# Altium footprint library CustomCase.PcbLib: 271 footprints (part 2 of 17)
Each footprint in its own frame and in the unit in brackets; x right, y up, seen from the top. Pads: shape width x height; smd on the part's side, far side on the other; paste and mask are expansions set on the pad; w line width, h text height; cw(c..) or ccw(c..) is an arc to the next point about the centre after c.
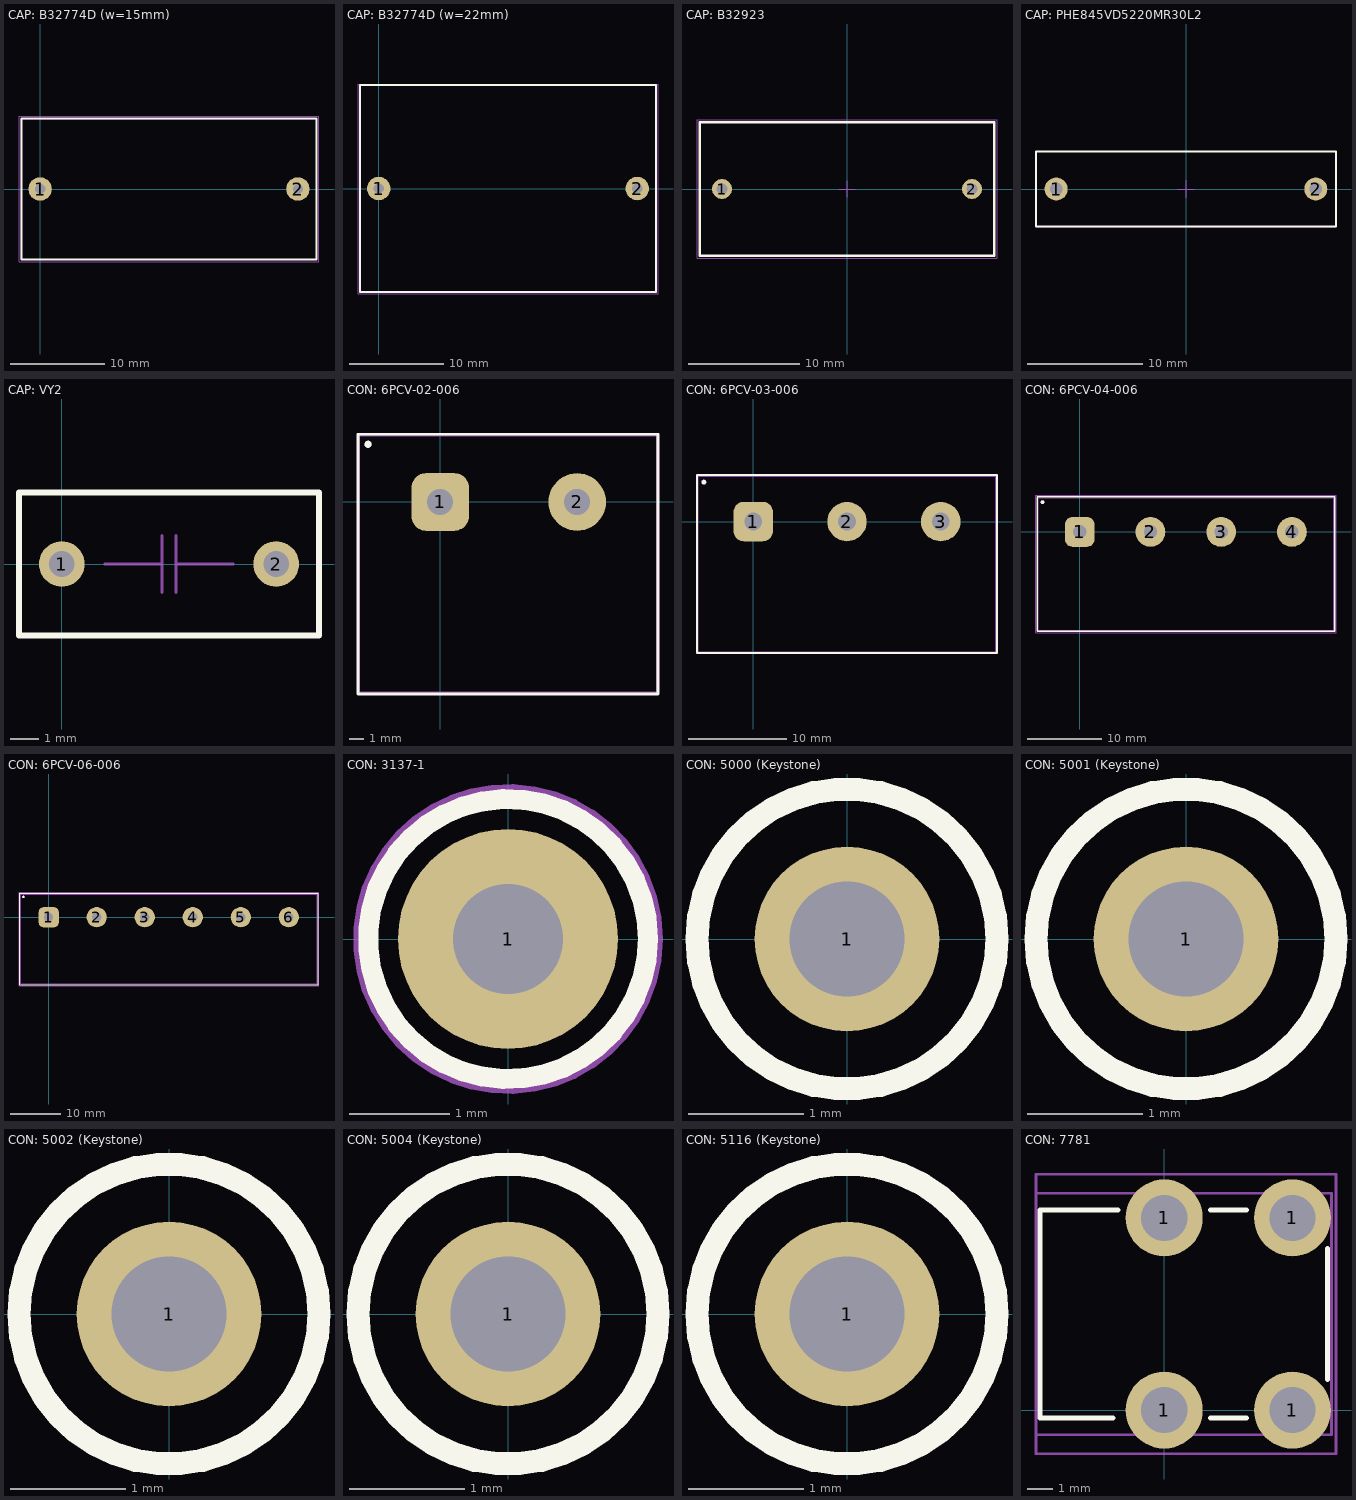
[diagram p1: the footprints below, top view; thin cyan lines are the x and y axes]

## CAP: B32774D (w=15mm) [mm]
pads (2):
  round 2.5 hole 1.1: 1(0,0) 2(27.5,0)
Top Overlay:
  lines w0.2: -2,-7.5 -2,7.5 29.5,7.5 29.5,-7.5 -2,-7.5
Top Assy:
  lines w0.1: -2,-7.5 -2,7.5 29.5,7.5 29.5,-7.5 -2,-7.5
Size Area:
  lines w0.1: -2.25,-7.75 -2.25,7.75 29.75,7.75 29.75,-7.75 -2.25,-7.75
3D body "2.STEP": height 24.55, standoff -2.95, extent -2,-7.5 29.5,7.5

## CAP: B32774D (w=22mm) [mm]
pads (2):
  round 2.5 hole 1.1: 1(0,0) 2(27.5,0)
Top Overlay:
  lines w0.2: -2,-11 -2,11 29.5,11 29.5,-11 -2,-11
Top Assy:
  lines w0.1: -2,-11 29.5,-11 29.5,11 -2,11 -2,-11
Size Area:
  lines w0.1: -2.2,-11.2 -2.2,11.1 29.7,11.1 29.7,-11.2 -2.2,-11.2
3D body "B32774D (w=22mm).STEP": height 36.5, standoff -3, extent -2,-11 29.5,11

## CAP: B32923 [mm]
pads (2):
  round 1.8 hole 1: 1(-11.25,0) 2(11.25,0)
Top Overlay:
  lines w0.2: -13.25,-6 13.25,-6 13.25,6 -13.25,6 -13.25,-6
Top Assy:
  lines w0.1: -13.25,-6 -13.25,6 13.25,6 13.25,-6 -13.25,-6
Size Area:
  lines w0.1: -0.75,0 0.75,0 ; 0,-0.75 0,0.75 ; -13.5,-6.25 13.5,-6.25 13.5,6.25 -13.5,6.25 -13.5,-6.25
3D body "B32923.STEP": height 22, standoff -3, extent -13.25,-6 13.25,6

## CAP: PHE845VD5220MR30L2 [mm]
pads (2):
  round 2 hole 1.1: 1(-11.25,-0.003) 2(11.25,-0.003)
Top Overlay:
  lines w0.2: -13,-3.253 13,-3.253 13,3.253 -13,3.253 -13,-3.253
Top Assy:
  lines w0.1: -13,-3.253 -13,3.253 13,3.253 13,-3.253 -13,-3.253
Size Area:
  lines w0.1: -0.75,-0.003 0.75,-0.003 ; 0,-0.75 0,0.75 ; -13,-3.253 -13,3.253 13,3.253 13,-3.253 -13,-3.253
3D body "кап.STEP": height 14.55, standoff -3.95, extent -13,-3.253 13,3.253

## CAP: VY2 [mm]
pads (2):
  round 1.6 hole 0.9: 1(0,0) 2(7.5,0)
Top Overlay:
  lines w0.2: 9,-2.5 -1.5,-2.5 -1.5,2.5 9,2.5 9,-2.5 ; 9,-2.5 9,-2.5
Top Assy:
  lines w0.1: 1.5,0 3.5,0 3.5,1 3.5,-1 ; 4,-1 4,1 4,0 6,0 ; -1.5,-2.5 9,-2.5 9,2.5 -1.5,2.5 -1.5,-2.5
Size Area:
  lines w0.1: -1.5,-2.5 -1.5,-2.5 ; -1.5,-2.5 9,-2.5 9,2.5 -1.5,2.5 -1.5,-2.5
3D body "777.STEP": height 14.75, standoff -1.75, extent -1.5,-2.5 9,2.5

## CON: 6PCV-02-006 [mm]
pads (4):
  rrect50% 4x4 hole 1.8: 1(0,0)
  round 4 hole 1.8: 2(9.5,0)
  round 0.5 on Mech1: ""(-5,4)
  round 0.5 on Top Overlay: ""(-5,4)
Top Overlay:
  lines w0.2: -5.7,-13.3 15.1,-13.3 15.1,4.7 -5.7,4.7 -5.7,-13.3
Top Assy:
  lines w0.1: -5.6,-13.2 15,-13.2 15,4.58 -5.6,4.58 -5.6,-13.2
  text "1" at -0.2,-3.6 h2
  text "2" at 9.2,-3.6 h2
Size Area:
  lines w0.1: -5.7,-13.3 -5.7,4.7 15.1,4.7 15.1,-13.3 -5.7,-13.3
3D body "02.STEP": height 15.96, standoff -4.99, extent -5.6,-13.2 15,4.58

## CON: 6PCV-03-006 [mm]
pads (4):
  rrect50% 4x4 hole 1.8: 1(0,0)
  round 4 hole 1.8: 2(9.5,0) 3(19,0)
  round 0.5 on Top Overlay: ""(-5,4)
Top Overlay:
  lines w0.2: -5.7,-13.3 24.7,-13.3 24.7,4.7 -5.7,4.7 -5.7,-13.3
Top Assy:
  lines w0.1: -5.562,-13.2 24.562,-13.2 24.562,4.58 -5.562,4.58 -5.562,-13.2
  text "3" at 18.8,-3.6 h2
  text "2" at 9.2,-3.6 h2
  text "1" at -0.2,-3.6 h2
Size Area:
  lines w0.1: -5.675,-13.3 24.675,-13.3 24.675,4.675 -5.675,4.675 -5.675,-13.3
3D body "03.STEP": height 15.96, standoff -4.99, extent -5.562,-13.2 24.562,4.58

## CON: 6PCV-04-006 [mm]
pads (6):
  rrect50% 4x4 hole 1.8: 1(0,0)
  round 4 hole 1.8: 2(9.5,0) 3(19,0) 4(28.5,0)
  round 0.5 on Mech1: ""(-5,4)
  round 0.5 on Top Overlay: ""(-5,4)
Top Overlay:
  lines w0.2: -5.7,-13.35 -5.7,4.725 34.25,4.725 34.25,-13.35 -5.7,-13.35
Top Assy:
  lines w0.1: -5.55,-13.2 -5.55,4.58 34.1,4.58 34.1,-13.2 -5.55,-13.2
  text "1" at -0.2,-3.6 h2
  text "2" at 9.2,-3.6 h2
  text "3" at 18.8,-3.6 h2
  text "4" at 28.2,-3.6 h2
Size Area:
  lines w0.1: -5.875,-13.525 -5.875,4.9 34.425,4.9 34.425,-13.525 -5.875,-13.525
3D body "6pcv-04-006.STEP": height 15.96, standoff -4.99, extent -5.525,-13.18 34.125,4.6

## CON: 6PCV-06-006 [mm]
pads (8):
  rrect50% 4x4 hole 1.8: 1(0,0)
  round 4 hole 1.8: 2(9.5,0) 3(19,0) 4(28.5,0) 5(38,0) 6(47.5,0)
  round 0.5 on Mech1: ""(-5,4)
  round 0.5 on Top Overlay: ""(-5,4)
Top Overlay:
  lines w0.2: -5.7,-13.35 53.3,-13.35 53.3,4.725 -5.7,4.725 -5.7,-13.35
Top Assy:
  lines w0.1: -5.55,-13.2 53.15,-13.2 53.15,4.58 -5.55,4.58 -5.55,-13.2
  text "6" at 47.2,-3.5 h2
  text "5" at 37.7,-3.6 h2
  text "4" at 28.2,-3.6 h2
  text "3" at 18.8,-3.6 h2
  text "2" at 9.2,-3.6 h2
  text "1" at -0.2,-3.6 h2
Size Area:
  lines w0.1: -5.875,-13.525 53.475,-13.525 53.475,4.9 -5.875,4.9 -5.875,-13.525
3D body "6pcv-06-006.STEP": height 15.96, standoff -4.99, extent -5.55,-13.2 53.15,4.58

## CON: 3137-1 [mm]
pads (1):
  round 2.2 hole 1.1: 1(0,0)
Top Overlay:
  circle w0.2: c0,0 r1.4
Top Assy:
  circle w0.1: c0,0 r1.4
Size Area:
  circle w0.1: c0,0 r1.5
3D body "mill-max-3137-1-00-15-00-00-08-0.STEP": height 1.1, standoff -6.57, extent -0.775,-0.775 0.8,0.8

## CON: 5000 (Keystone) [mm]
pads (1):
  round 1.6 hole 1: 1(0,0)
Top Overlay:
  circle w0.2: c0,0 r1.3
Top Assy:
  circle w0.1: c0,0 r1.3
Size Area:
  circle w0.1: c0,0 r1.3
3D body "User Library-TEST POINT RED Keystone 5000.STEP": height 4.94, standoff -3.02, extent -1.27,-1.27 1.27,1.27

## CON: 5001 (Keystone) [mm]
pads (1):
  round 1.6 hole 1: 1(0,0)
Top Overlay:
  circle w0.2: c0,0 r1.3
Top Assy:
  circle w0.1: c0,0 r1.3
Size Area:
  circle w0.1: c0,0 r1.3
3D body "User Library-TEST POINT BLK Keystone 5001.STEP": height 4.94, standoff -3.02, extent -1.27,-1.27 1.27,1.27

## CON: 5002 (Keystone) [mm]
pads (1):
  round 1.6 hole 1: 1(0,0)
Top Overlay:
  circle w0.2: c0,0 r1.3
Top Assy:
  circle w0.1: c0,0 r1.3
Size Area:
  circle w0.1: c0,0 r1.3
3D body "User Library-TEST POINT WHT Keystone 5002.STEP": height 4.94, standoff -3.02, extent -1.27,-1.27 1.27,1.27

## CON: 5004 (Keystone) [mm]
pads (1):
  round 1.6 hole 1: 1(0,0)
Top Overlay:
  circle w0.2: c0,0 r1.3
Top Assy:
  circle w0.1: c0,0 r1.3
Size Area:
  circle w0.1: c0,0 r1.3
3D body "User Library-TEST POINT YEL Keystone 5004.STEP": height 4.94, standoff -3.02, extent -1.27,-1.27 1.27,1.27

## CON: 5116 (Keystone) [mm]
pads (1):
  round 1.6 hole 1: 1(0,0)
Top Overlay:
  circle w0.2: c0,0 r1.3
Top Assy:
  circle w0.1: c0,0 r1.3
Size Area:
  circle w0.1: c0,0 r1.3
3D body "User Library-TEST POINT GRN Keystone 5116.STEP": height 4.94, standoff -3.02, extent -1.27,-1.27 1.27,1.27

## CON: 7781 [mm]
pads (4):
  round 3 hole 1.8: 1(0,0) 1(0,7.5) 1(5,0) 1(5,7.5)
Top Overlay:
  lines w0.2: -2,-0.3 -4.85,-0.3 -4.85,7.8 -1.8,7.8 ; 1.8,-0.3 3.2,-0.3 ; 1.8,7.8 3.2,7.8 ; 6.375,1.2 6.375,6.3
Top Assy:
  lines w0.1: -5,-0.957 6.523,-0.957 6.523,8.457 -5,8.457 -5,-0.957
Size Area:
  lines w0.1: -5,-1.7 -5,9.2 6.7,9.2 6.7,-1.7 -5,-1.7
3D body "keystone-PN7781.STEP": height 8.01, standoff -4.99, extent -5,-0.957 6.523,8.457